# Altium footprint library Quectel.PCBLIB: 25 footprints (part 1 of 2)
Each footprint in its own frame and in the unit in brackets; x right, y up, seen from the top. Pads: shape width x height; smd on the part's side, far side on the other; paste and mask are expansions set on the pad; w line width, h text height; cw(c..) or ccw(c..) is an arc to the next point about the centre after c.
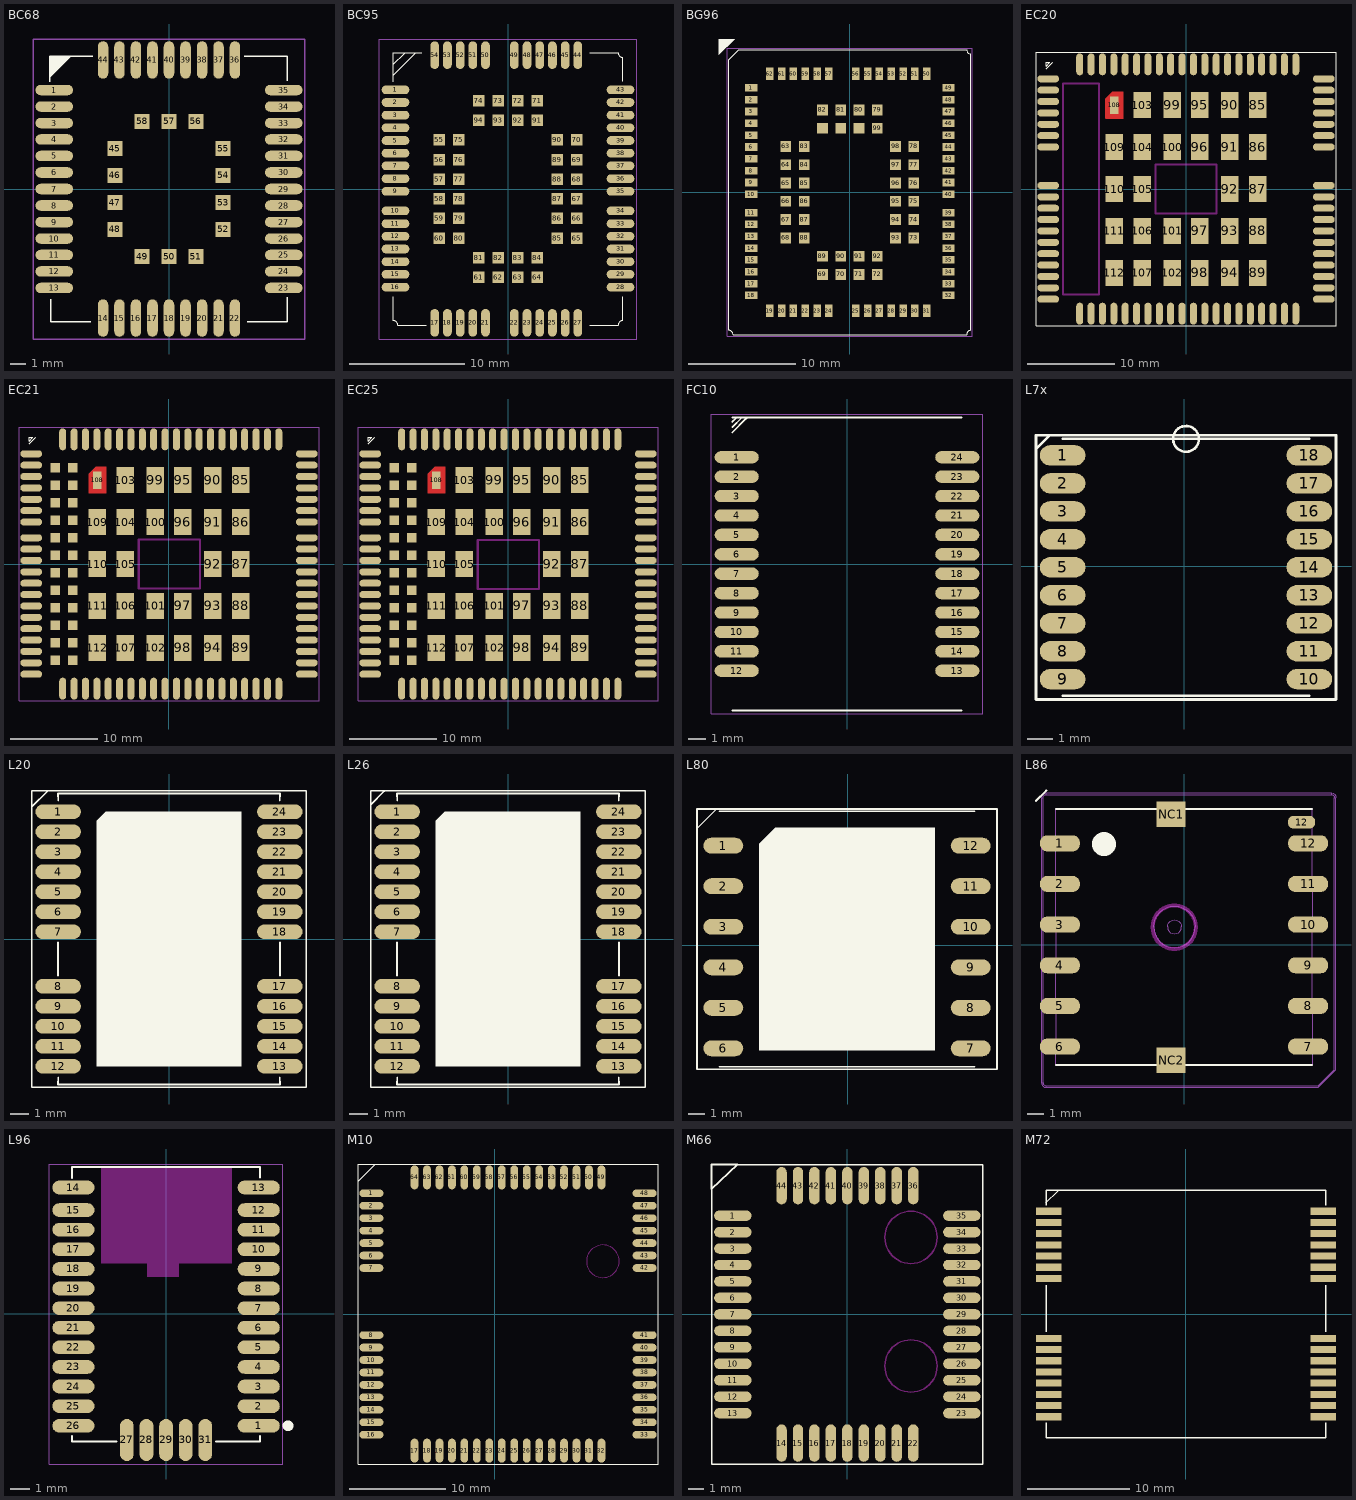
[diagram p0: the footprints below, top view; thin cyan lines are the x and y axes]

## BC68 [mm] "BC68 15.8X17.7mm H2.05mm RO"
height 2.05
pads (58):
  oval 2.5x0.7 smd paste+0 mask+0.05: 1(-7.65,6.6) 2(-7.65,5.5) 3(-7.65,4.4) 4(-7.65,3.3) 5(-7.65,2.2) 6(-7.65,1.1) 7(-7.65,0) 8(-7.65,-1.1) 9(-7.65,-2.2) 10(-7.65,-3.3) 11(-7.65,-4.4) 12(-7.65,-5.5) 13(-7.65,-6.6) 23(7.65,-6.6) 24(7.65,-5.5) 25(7.65,-4.4) 26(7.65,-3.3) 27(7.65,-2.2) 28(7.65,-1.1) 29(7.65,0) 30(7.65,1.1) 31(7.65,2.2) 32(7.65,3.3) 33(7.65,4.4) 34(7.65,5.5) 35(7.65,6.6)
  oval 0.7x2.5 smd paste+0 mask+0.05: 14(-4.4,-8.6) 15(-3.3,-8.6) 16(-2.2,-8.6) 17(-1.1,-8.6) 18(0,-8.6) 19(1.1,-8.6) 20(2.2,-8.6) 21(3.3,-8.6) 22(4.4,-8.6) 36(4.4,8.6) 37(3.3,8.6) 38(2.2,8.6) 39(1.1,8.6) 40(0,8.6) 41(-1.1,8.6) 42(-2.2,8.6) 43(-3.3,8.6) 44(-4.4,8.6)
  rect 1x1 smd mask+0.05: 45(-3.6,2.7) 46(-3.6,0.9) 47(-3.6,-0.9) 48(-3.6,-2.7) 49(-1.8,-4.5) 50(0,-4.5) 51(1.8,-4.5) 52(3.6,-2.7) 53(3.6,-0.9) 54(3.6,0.9) 55(3.6,2.7) 56(1.8,4.5) 57(0,4.5) 58(-1.8,4.5)
Top Overlay:
  region: -7.964,7.403 -7.964,8.865 -6.502,8.865
  lines w0.1: -7.95,7.163 -7.95,8.839 -5.08,8.85 ; -7.9,-7.341 -7.9,-8.85 -5.232,-8.85 ; 5.029,8.839 7.874,8.85 ; 5.206,-8.85 7.874,-8.85 7.874,-7.214 ; 7.9,7.214 7.9,8.85
Mechanical 1:
  lines w0.1: -9.05,-10 -9.05,10 9.05,10 9.05,-10 -9.05,-10
3D body "Quectel_BC68_3Dfile_201806292.stp": height 2, standoff 0, extent -7.926,-8.865 7.874,8.835
3D body: height 1.99, standoff 1, extent -6.325,-7.188 6.299,7.214
3D body: height 2, standoff 1, extent -5.918,4.216 -4.394,4.76

## BC95 [mm]
pads (94):
  oval 2.4x0.75 smd: 1(-9.75,8.6) 2(-9.75,7.5) 3(-9.75,6.4) 4(-9.75,5.3) 5(-9.75,4.2) 6(-9.75,3.1) 7(-9.75,2) 8(-9.75,0.9) 9(-9.75,-0.2) 10(-9.75,-1.9) 11(-9.75,-3) 12(-9.75,-4.1) 13(-9.75,-5.2) 14(-9.75,-6.3) 15(-9.75,-7.4) 16(-9.75,-8.5) 28(9.75,-8.5) 29(9.75,-7.4) 30(9.75,-6.3) 31(9.75,-5.2) 32(9.75,-4.1) 33(9.75,-3) 34(9.75,-1.9) 35(9.75,-0.2) 36(9.75,0.9) 37(9.75,2) 38(9.75,3.1) 39(9.75,4.2) 40(9.75,5.3) 41(9.75,6.4) 42(9.75,7.5) 43(9.75,8.6)
  oval 0.75x2.4 smd: 17(-6.35,-11.6) 18(-5.25,-11.6) 19(-4.15,-11.6) 20(-3.05,-11.6) 21(-1.95,-11.6) 22(0.55,-11.6) 23(1.65,-11.6) 24(2.75,-11.6) 25(3.85,-11.6) 26(4.95,-11.6) 27(6.05,-11.6) 44(6.05,11.6) 45(4.95,11.6) 46(3.85,11.6) 47(2.75,11.6) 48(1.65,11.6) 49(0.55,11.6) 50(-1.95,11.6) 51(-3.05,11.6) 52(-4.15,11.6) 53(-5.25,11.6) 54(-6.35,11.6)
  rect 1x1 smd: 55(-5.95,4.25) 56(-5.95,2.55) 57(-5.95,0.85) 58(-5.95,-0.85) 59(-5.95,-2.55) 60(-5.95,-4.25) 61(-2.55,-7.65) 62(-0.85,-7.65) 63(0.85,-7.65) 64(2.55,-7.65) 65(5.95,-4.25) 66(5.95,-2.55) 67(5.95,-0.85) 68(5.95,0.85) 69(5.95,2.55) 70(5.95,4.25) 71(2.55,7.65) 72(0.85,7.65) 73(-0.85,7.65) 74(-2.55,7.65) 75(-4.25,4.25) 76(-4.25,2.55) 77(-4.25,0.85) 78(-4.25,-0.85) 79(-4.25,-2.55) 80(-4.25,-4.25) 81(-2.55,-5.95) 82(-0.85,-5.95) 83(0.85,-5.95) 84(2.55,-5.95) 85(4.25,-4.25) 86(4.25,-2.55) 87(4.25,-0.85) 88(4.25,0.85) 89(4.25,2.55) 90(4.25,4.25) 91(2.55,5.95) 92(0.85,5.95) 93(-0.85,5.95) 94(-2.55,5.95)
Top Overlay:
  lines w0.1: -9.95,-9.321 -9.95,-11.4 cw(c-9.95,-11.8) -9.55,-11.8 -7.087,-11.8 ; -9.95,9.296 -9.95,11.375 ; -9.95,9.851 -8.001,11.8 -9.271,11.8 ; -9.95,10.414 -9.95,11.8 ; -9.931,10.82 -8.966,11.786 ; -8.437,11.8 -9.95,11.8 ; -7.487,11.8 -9.95,11.8 ; 7.087,-11.8 9.55,-11.8 cw(c9.95,-11.8) 9.95,-11.4 9.95,-9.321 ; 7.087,11.8 9.55,11.8 ccw(c9.95,11.8) 9.95,11.4 9.95,9.321
Mechanical 1:
  lines w0.01: -11.15,-13 11.15,-13 11.15,13 -11.15,13 -11.15,-13
3D body "quectel_bc95_3dfile_20170315_asm.stp": height 2.2, standoff 0, extent -9.95,-11.8 9.95,11.8

## BG96 [mm]
pads (102):
  rect 1.15x0.7 smd mask+0.05: 1(-9.175,9.7) 2(-9.175,8.6) 3(-9.175,7.5) 4(-9.175,6.4) 5(-9.175,5.3) 6(-9.175,4.2) 7(-9.175,3.1) 8(-9.175,2) 9(-9.175,0.9) 10(-9.175,-0.2) 11(-9.175,-1.9) 12(-9.175,-3) 13(-9.175,-4.1) 14(-9.175,-5.2) 15(-9.175,-6.3) 16(-9.175,-7.4) 17(-9.175,-8.5) 18(-9.175,-9.6) 32(9.175,-9.6) 33(9.175,-8.5) 34(9.175,-7.4) 35(9.175,-6.3) 36(9.175,-5.2) 37(9.175,-4.1) 38(9.175,-3) 39(9.175,-1.9) 40(9.175,-0.2) 41(9.175,0.9) 42(9.175,2) 43(9.175,3.1) 44(9.175,4.2) 45(9.175,5.3) 46(9.175,6.4) 47(9.175,7.5) 48(9.175,8.6) 49(9.175,9.7)
  rect 0.7x1.15 smd mask+0.05: 19(-7.45,-11.025) 20(-6.35,-11.025) 21(-5.25,-11.025) 22(-4.15,-11.025) 23(-3.05,-11.025) 24(-1.95,-11.025) 25(0.55,-11.025) 26(1.65,-11.025) 27(2.75,-11.025) 28(3.85,-11.025) 29(4.95,-11.025) 30(6.05,-11.025) 31(7.15,-11.025) 50(7.15,11.025) 51(6.05,11.025) 52(4.95,11.025) 53(3.85,11.025) 54(2.75,11.025) 55(1.65,11.025) 56(0.55,11.025) 57(-1.95,11.025) 58(-3.05,11.025) 59(-4.15,11.025) 60(-5.25,11.025) 61(-6.35,11.025) 62(-7.45,11.025)
  rect 1x1 smd mask+0.05: 63(-5.95,4.25) 64(-5.95,2.55) 65(-5.95,0.85) 66(-5.95,-0.85) 67(-5.95,-2.55) 68(-5.95,-4.25) 69(-2.55,-7.65) 70(-0.85,-7.65) 71(0.85,-7.65) 72(2.55,-7.65) 73(5.95,-4.25) 74(5.95,-2.55) 75(5.95,-0.85) 76(5.95,0.85) 77(5.95,2.55) 78(5.95,4.25) 79(2.55,7.65) 80(0.85,7.65) 81(-0.85,7.65) 82(-2.55,7.65) 83(-4.25,4.25) 84(-4.25,2.55) 85(-4.25,0.85) 86(-4.25,-0.85) 87(-4.25,-2.55) 88(-4.25,-4.25) 89(-2.55,-5.95) 90(-0.85,-5.95) 91(0.85,-5.95) 92(2.55,-5.95) 93(4.25,-4.25) 94(4.25,-2.55) 95(4.25,-0.85) 96(4.25,0.85) 97(4.25,2.55) 98(4.25,4.25) 99(2.55,5.95) 100(0.85,5.95) 101(-0.85,5.95) 102(-2.55,5.95)
Top Overlay:
  region: -12.18,14.24 -10.68,14.24 -12.18,12.79
  lines w0.1: -11.25,-12.85 cw(c-11.25,-13.25) -10.85,-13.25 10.85,-13.25 cw(c11.25,-13.25) 11.25,-12.85 11.25,12.85 cw(c11.25,13.25) 10.85,13.25 -10.33,13.25 -11.25,12.33 -11.25,-12.85
Mechanical 1:
  lines w0.01: -11.4,-13.4 11.4,-13.4 11.4,13.4 -11.4,13.4 -11.4,-13.4
3D body: height 2.29, standoff 1, extent -10.592,-12.649 10.668,12.294
3D body "quectel_bg96_3dfile_171025.stp": height 2.3, standoff 0, extent -11.25,-13.25 11.25,13.25
3D body: height 2.3, standoff 1, extent -10.084,8.865 -7.341,9.743

## EC20 [mm]
pads (140):
  oval 2.5x0.8 smd: 1(-15.75,12.6) 2(-15.75,11.3) 3(-15.75,10) 4(-15.75,8.7) 5(-15.75,7.4) 6(-15.75,6.1) 7(-15.75,4.8) 8(-15.75,0.4) 9(-15.75,-0.9) 10(-15.75,-2.2) 11(-15.75,-3.5) 12(-15.75,-4.8) 13(-15.75,-6.1) 14(-15.75,-7.4) 15(-15.75,-8.7) 16(-15.75,-10) 17(-15.75,-11.3) 18(-15.75,-12.6) 37(15.75,-12.6) 38(15.75,-11.3) 39(15.75,-10) 40(15.75,-8.7) 41(15.75,-7.4) 42(15.75,-6.1) 43(15.75,-4.8) 44(15.75,-3.5) 45(15.75,-2.2) 46(15.75,-0.9) 47(15.75,0.4) 48(15.75,4.8) 49(15.75,6.1) 50(15.75,7.4) 51(15.75,8.7) 52(15.75,10) 53(15.75,11.3) 54(15.75,12.6)
  oval 0.8x2.5 smd: 19(-9.55,-14.25) 20(-8.25,-14.25) 21(-6.95,-14.25) 22(-5.65,-14.25) 23(-4.35,-14.25) 24(-3.05,-14.25) 25(-1.75,-14.25) 26(-0.45,-14.25) 27(0.85,-14.25) 28(2.15,-14.25) 29(3.45,-14.25) 30(4.75,-14.25) 31(6.05,-14.25) 32(7.35,-14.25) 33(8.65,-14.25) 34(9.95,-14.25) 35(11.25,-14.25) 36(12.55,-14.25) 55(12.55,14.25) 56(11.25,14.25) 57(9.95,14.25) 58(8.65,14.25) 59(7.35,14.25) 60(6.05,14.25) 61(4.75,14.25) 62(3.45,14.25) 63(2.15,14.25) 64(0.85,14.25) 65(-0.45,14.25) 66(-1.75,14.25) 67(-3.05,14.25) 68(-4.35,14.25) 69(-5.65,14.25) 70(-6.95,14.25) 71(-8.25,14.25) 72(-9.55,14.25) 113(-10.85,14.25) 114(-12.15,14.25) 115(-10.85,-14.25) 116(-12.15,-14.25)
  rect 0x0 all layers, no hole: 73(2.4,1.6) 74(2.4,0) 75(2.4,-1.6) 76(0.8,1.6) 77(0.8,0) 78(0.8,-1.6) 79(-0.8,1.6) 80(-0.8,0) 81(-0.8,-1.6) 82(-2.4,1.6) 83(-2.4,0) 84(-2.4,-1.6) 117(-11,11) 118(-11,9) 119(-11,7) 120(-11,5) 121(-11,3) 122(-11,1) 123(-11,-1) 124(-11,-3) 125(-11,-5) 126(-11,-7) 127(-11,-9) 128(-11,-11) 129(-13,11) 130(-13,9) 131(-13,7) 132(-13,5) 133(-13,3) 134(-13,1) 135(-13,-1) 136(-13,-3) 137(-13,-5) 138(-13,-7) 139(-13,-9) 140(-13,-11)
  rect 2x3 smd: 85(8.2,9.6) 86(8.2,4.8) 87(8.2,0) 88(8.2,-4.8) 89(8.2,-9.6) 90(5,9.6) 91(5,4.8) 92(5,0) 93(5,-4.8) 94(5,-9.6) 95(1.6,9.6) 96(1.6,4.8) 97(1.6,-4.8) 98(1.6,-9.6) 99(-1.6,9.6) 100(-1.6,4.8) 101(-1.6,-4.8) 102(-1.6,-9.6) 103(-5,9.6) 104(-5,4.8) 105(-5,0) 106(-5,-4.8) 107(-5,-9.6) 109(-8.2,4.8) 110(-8.2,0) 111(-8.2,-4.8) 112(-8.2,-9.6)
  rect 1x2 smd: 108(-8.2,9.6)
Top Layer:
  rectangle: -8.357,8.1 -7.2,11.1
  rectangle: -9.169,8.1 -8.306,10.312
  rectangle: -8.458,10.109 -8.103,11.074
  rectangle: -8.534,10.109 -8.331,10.973
  rectangle: -8.636,10.185 -8.458,10.922
  rectangle: -8.712,10.185 -8.484,10.82
  rectangle: -8.788,10.16 -8.611,10.744
  rectangle: -8.865,10.185 -8.712,10.668
  rectangle: -8.941,10.262 -8.839,10.592
  rectangle: -9.017,10.262 -8.915,10.49
  rectangle: -9.093,10.262 -8.966,10.439
  rectangle: -9.119,10.262 -9.068,10.389
  lines w0.1: -9.2,8.1 -7.2,8.1 -7.2,11.1 -8.4,11.1 -9.2,10.3 -9.2,8.1
Top Layer keep-out:
  lines w0.254: -14.05,-12.05 -14.05,12.05 -9.95,12.05 -9.95,-12.05 -14.05,-12.05 ; -3.5,-2.8 -3.5,2.8 3.5,2.8 3.5,-2.8 -3.5,-2.8
Top Overlay:
  lines w0.01: -17.15,-15.65 17.15,-15.65 17.15,15.65 -17.15,15.65 -17.15,-15.65
  lines w0.102: -16,13.75 -15.25,14.5 ; -16,14.05 -16,14.5 -15.55,14.5 -16,14.05
Top Paste:
  rectangle: -9.144,10.262 -9.042,10.389
  rectangle: -9.068,10.287 -8.966,10.439
  rectangle: -8.992,10.363 -8.839,10.541
  rectangle: -8.865,10.389 -8.788,10.668
  rectangle: -8.814,10.541 -8.661,10.693
  rectangle: -8.636,10.516 -8.23,10.897
  rectangle: -8.433,10.973 -8.28,11.074
  rectangle: -8.56,10.82 -8.382,10.998
  rectangle: -8.712,10.693 -8.585,10.846
  rectangle: -9.093,10.287 -8.966,10.363
  rectangle: -8.89,10.389 -8.763,10.592
  rectangle: -8.738,10.516 -8.534,10.719
  rectangle: -8.611,10.592 -8.458,10.871
  rectangle: -8.458,10.897 -8.357,11.024
  rectangle: -8.534,10.617 -8.128,10.922
  rectangle: -8.814,10.439 -8.128,10.617
  rectangle: -9.017,10.3 -8.128,10.439
  rectangle: -8.382,8.1 -7.2,11.1
  rectangle: -9.2,8.128 -8.128,10.3
  lines w0.1: -9.2,8.1 -7.2,8.1 -7.2,11.1 -8.4,11.1 -9.2,10.3 -9.2,8.1
Top Solder:
  rectangle: -8.458,8.103 -7.15,11.15
  rectangle: -9.22,8.05 -8.357,10.363
  rectangle: -8.534,10.668 -8.407,11.074
  rectangle: -8.611,10.693 -8.509,10.998
  rectangle: -8.687,10.693 -8.611,10.947
  rectangle: -8.763,10.643 -8.661,10.871
  rectangle: -8.839,10.592 -8.738,10.795
  rectangle: -8.915,10.312 -8.763,10.719
  rectangle: -9.017,10.287 -8.839,10.617
  rectangle: -9.093,10.287 -8.966,10.541
  rectangle: -9.169,10.287 -9.017,10.465
  lines w0.1: -9.25,8.05 -7.15,8.05 -7.15,11.15 -8.45,11.15 -9.25,10.35 -9.25,8.05
3D body "ec20_3d_20150717_asm.stp": height 2.4, standoff 0, extent -16.002,-14.503 15.998,14.497

## EC21 [mm]
pads (132):
  oval 2.5x0.8 smd: 1(-15.75,12.6) 2(-15.75,11.3) 3(-15.75,10) 4(-15.75,8.7) 5(-15.75,7.4) 6(-15.75,6.1) 7(-15.75,4.8) 8(-15.75,0.4) 9(-15.75,-0.9) 10(-15.75,-2.2) 11(-15.75,-3.5) 12(-15.75,-4.8) 13(-15.75,-6.1) 14(-15.75,-7.4) 15(-15.75,-8.7) 16(-15.75,-10) 17(-15.75,-11.3) 18(-15.75,-12.6) 37(15.75,-12.6) 38(15.75,-11.3) 39(15.75,-10) 40(15.75,-8.7) 41(15.75,-7.4) 42(15.75,-6.1) 43(15.75,-4.8) 44(15.75,-3.5) 45(15.75,-2.2) 46(15.75,-0.9) 47(15.75,0.4) 48(15.75,4.8) 49(15.75,6.1) 50(15.75,7.4) 51(15.75,8.7) 52(15.75,10) 53(15.75,11.3) 54(15.75,12.6) 141(-15.75,3) 142(-15.75,1.7) 143(15.75,1.7) 144(15.75,3)
  oval 0.8x2.5 smd: 19(-9.55,-14.25) 20(-8.25,-14.25) 21(-6.95,-14.25) 22(-5.65,-14.25) 23(-4.35,-14.25) 24(-3.05,-14.25) 25(-1.75,-14.25) 26(-0.45,-14.25) 27(0.85,-14.25) 28(2.15,-14.25) 29(3.45,-14.25) 30(4.75,-14.25) 31(6.05,-14.25) 32(7.35,-14.25) 33(8.65,-14.25) 34(9.95,-14.25) 35(11.25,-14.25) 36(12.55,-14.25) 55(12.55,14.25) 56(11.25,14.25) 57(9.95,14.25) 58(8.65,14.25) 59(7.35,14.25) 60(6.05,14.25) 61(4.75,14.25) 62(3.45,14.25) 63(2.15,14.25) 64(0.85,14.25) 65(-0.45,14.25) 66(-1.75,14.25) 67(-3.05,14.25) 68(-4.35,14.25) 69(-5.65,14.25) 70(-6.95,14.25) 71(-8.25,14.25) 72(-9.55,14.25) 113(-10.85,14.25) 114(-12.15,14.25) 115(-10.85,-14.25) 116(-12.15,-14.25)
  rect 2x3 smd: 85(8.2,9.6) 86(8.2,4.8) 87(8.2,0) 88(8.2,-4.8) 89(8.2,-9.6) 90(5,9.6) 91(5,4.8) 92(5,0) 93(5,-4.8) 94(5,-9.6) 95(1.6,9.6) 96(1.6,4.8) 97(1.6,-4.8) 98(1.6,-9.6) 99(-1.6,9.6) 100(-1.6,4.8) 101(-1.6,-4.8) 102(-1.6,-9.6) 103(-5,9.6) 104(-5,4.8) 105(-5,0) 106(-5,-4.8) 107(-5,-9.6) 109(-8.2,4.8) 110(-8.2,0) 111(-8.2,-4.8) 112(-8.2,-9.6)
  rect 1x2 smd: 108(-8.2,9.6)
  rect 1.1x1.1 smd: 117(-11,11) 118(-11,9) 119(-11,7) 120(-11,5) 121(-11,3) 122(-11,1) 123(-11,-1) 124(-11,-3) 125(-11,-5) 126(-11,-7) 127(-11,-9) 128(-11,-11) 129(-13,11) 130(-13,9) 131(-13,7) 132(-13,5) 133(-13,3) 134(-13,1) 135(-13,-1) 136(-13,-3) 137(-13,-5) 138(-13,-7) 139(-13,-9) 140(-13,-11)
Top Layer:
  region: -9.2,10.3 -8.4,11.1 -7.2,11.1 -7.2,8.1 -9.2,8.1
Top Layer keep-out:
  lines w0.254: -3.449,-2.8 3.551,-2.8 3.551,2.8 -3.449,2.8 -3.449,-2.8
Top Overlay:
  lines w0.102: -16,13.75 -15.25,14.5 ; -16,14.05 -16,14.5 -15.55,14.5 -16,14.05
Top Paste:
  region: -9.2,10.3 -8.4,11.1 -7.2,11.1 -7.2,8.1 -9.2,8.1
Top Solder:
  region: -9.25,8.05 -7.15,8.05 -7.15,11.15 -8.45,11.15 -9.25,10.35
Mechanical 1:
  lines w0.01: -17.15,-15.65 17.15,-15.65 17.15,15.65 -17.15,15.65 -17.15,-15.65
3D body "Quectel EC21-AUTL.step": height 2.55, standoff 0.01, extent -16.002,-14.557 16.028,14.503

## EC25 [mm]
pads (132):
  oval 2.5x0.8 smd: 1(-15.75,12.6) 2(-15.75,11.3) 3(-15.75,10) 4(-15.75,8.7) 5(-15.75,7.4) 6(-15.75,6.1) 7(-15.75,4.8) 8(-15.75,0.4) 9(-15.75,-0.9) 10(-15.75,-2.2) 11(-15.75,-3.5) 12(-15.75,-4.8) 13(-15.75,-6.1) 14(-15.75,-7.4) 15(-15.75,-8.7) 16(-15.75,-10) 17(-15.75,-11.3) 18(-15.75,-12.6) 37(15.75,-12.6) 38(15.75,-11.3) 39(15.75,-10) 40(15.75,-8.7) 41(15.75,-7.4) 42(15.75,-6.1) 43(15.75,-4.8) 44(15.75,-3.5) 45(15.75,-2.2) 46(15.75,-0.9) 47(15.75,0.4) 48(15.75,4.8) 49(15.75,6.1) 50(15.75,7.4) 51(15.75,8.7) 52(15.75,10) 53(15.75,11.3) 54(15.75,12.6) 141(-15.75,3) 142(-15.75,1.7) 143(15.75,1.7) 144(15.75,3)
  oval 0.8x2.5 smd: 19(-9.55,-14.25) 20(-8.25,-14.25) 21(-6.95,-14.25) 22(-5.65,-14.25) 23(-4.35,-14.25) 24(-3.05,-14.25) 25(-1.75,-14.25) 26(-0.45,-14.25) 27(0.85,-14.25) 28(2.15,-14.25) 29(3.45,-14.25) 30(4.75,-14.25) 31(6.05,-14.25) 32(7.35,-14.25) 33(8.65,-14.25) 34(9.95,-14.25) 35(11.25,-14.25) 36(12.55,-14.25) 55(12.55,14.25) 56(11.25,14.25) 57(9.95,14.25) 58(8.65,14.25) 59(7.35,14.25) 60(6.05,14.25) 61(4.75,14.25) 62(3.45,14.25) 63(2.15,14.25) 64(0.85,14.25) 65(-0.45,14.25) 66(-1.75,14.25) 67(-3.05,14.25) 68(-4.35,14.25) 69(-5.65,14.25) 70(-6.95,14.25) 71(-8.25,14.25) 72(-9.55,14.25) 113(-10.85,14.25) 114(-12.15,14.25) 115(-10.85,-14.25) 116(-12.15,-14.25)
  rect 2x3 smd: 85(8.2,9.6) 86(8.2,4.8) 87(8.2,0) 88(8.2,-4.8) 89(8.2,-9.6) 90(5,9.6) 91(5,4.8) 92(5,0) 93(5,-4.8) 94(5,-9.6) 95(1.6,9.6) 96(1.6,4.8) 97(1.6,-4.8) 98(1.6,-9.6) 99(-1.6,9.6) 100(-1.6,4.8) 101(-1.6,-4.8) 102(-1.6,-9.6) 103(-5,9.6) 104(-5,4.8) 105(-5,0) 106(-5,-4.8) 107(-5,-9.6) 109(-8.2,4.8) 110(-8.2,0) 111(-8.2,-4.8) 112(-8.2,-9.6)
  rect 1x2 smd: 108(-8.2,9.6)
  rect 1.1x1.1 smd: 117(-11,11) 118(-11,9) 119(-11,7) 120(-11,5) 121(-11,3) 122(-11,1) 123(-11,-1) 124(-11,-3) 125(-11,-5) 126(-11,-7) 127(-11,-9) 128(-11,-11) 129(-13,11) 130(-13,9) 131(-13,7) 132(-13,5) 133(-13,3) 134(-13,1) 135(-13,-1) 136(-13,-3) 137(-13,-5) 138(-13,-7) 139(-13,-9) 140(-13,-11)
Top Layer:
  region: -9.2,10.3 -8.4,11.1 -7.2,11.1 -7.2,8.1 -9.2,8.1
Top Layer keep-out:
  lines w0.254: -3.449,-2.851 3.551,-2.851 3.551,2.749 -3.449,2.749 -3.449,-2.851
Top Overlay:
  lines w0.102: -16,13.75 -15.25,14.5 ; -16,14.05 -16,14.5 -15.55,14.5 -16,14.05
Top Paste:
  region: -9.2,10.3 -8.4,11.1 -7.2,11.1 -7.2,8.1 -9.2,8.1
Top Solder:
  region: -9.25,8.05 -7.15,8.05 -7.15,11.15 -8.45,11.15 -9.25,10.35
Mechanical 1:
  lines w0.01: -17.15,-15.65 17.15,-15.65 17.15,15.65 -17.15,15.65 -17.15,-15.65
3D body "ec25_3d_20160713_asm.stp": height 2.4, standoff 0, extent -16.002,-14.497 15.998,14.503

## FC10 [mm]
pads (24):
  oval 2.5x0.7 smd: 1(-6.25,6.05) 2(-6.25,4.95) 3(-6.25,3.85) 4(-6.25,2.75) 5(-6.25,1.65) 6(-6.25,0.55) 7(-6.25,-0.55) 8(-6.25,-1.65) 9(-6.25,-2.75) 10(-6.25,-3.85) 11(-6.25,-4.95) 12(-6.25,-6.05) 13(6.25,-6.05) 14(6.25,-4.95) 15(6.25,-3.85) 16(6.25,-2.75) 17(6.25,-1.65) 18(6.25,-0.55) 19(6.25,0.55) 20(6.25,1.65) 21(6.25,2.75) 22(6.25,3.85) 23(6.25,4.95) 24(6.25,6.05)
Top Overlay:
  lines w0.1: -6.5,-8.3 6.5,-8.3 ; -6.5,8.3 6.5,8.3
  lines w0.102: -6.5,7.45 -5.7,8.25 ; -6.5,7.75 -5.95,8.3 ; -6.5,8.05 -6.25,8.3
Mechanical 1:
  lines w0.01: -7.7,-8.5 -7.7,8.5 7.7,8.5 7.7,-8.5 -7.7,-8.5
3D body "fc20_3d_160530_asm.stp": height 2.2, standoff 0, extent -6.449,-8.3 6.551,8.3

## L7x [mm]
pads (18):
  oval 1.8x0.8 smd: 1(-4.772,4.354) 2(-4.772,3.254) 3(-4.772,2.154) 4(-4.772,1.054) 5(-4.772,-0.046) 6(-4.772,-1.146) 7(-4.772,-2.246) 8(-4.772,-3.346) 9(-4.772,-4.446) 10(4.928,-4.446) 11(4.928,-3.346) 12(4.928,-2.246) 13(4.928,-1.146) 14(4.928,-0.046) 15(4.928,1.054) 16(4.928,2.154) 17(4.928,3.254) 18(4.928,4.354)
Top Overlay:
  circle w0.102: c0.078,5.004 r0.508
  lines w0.102: -5.822,4.604 -5.272,5.154 ; -4.772,-5.096 4.928,-5.096 ; -4.772,5.004 4.928,5.004 ; -5.822,-5.246 -5.822,5.154 5.978,5.154 5.978,-5.246 -5.822,-5.246
3D body "L70_3d_150728_asm.stp": height 2.5, standoff 0, extent -4.775,-5.105 4.925,4.995

## L20 [mm]
pads (24):
  oval 2.5x0.8 smd: 1(-6.1,7) 2(-6.1,5.9) 3(-6.1,4.8) 4(-6.1,3.7) 5(-6.1,2.6) 6(-6.1,1.5) 7(-6.1,0.4) 8(-6.1,-2.6) 9(-6.1,-3.7) 10(-6.1,-4.8) 11(-6.1,-5.9) 12(-6.1,-7) 13(6.1,-7) 14(6.1,-5.9) 15(6.1,-4.8) 16(6.1,-3.7) 17(6.1,-2.6) 18(6.1,0.4) 19(6.1,1.5) 20(6.1,2.6) 21(6.1,3.7) 22(6.1,4.8) 23(6.1,5.9) 24(6.1,7)
Top Overlay:
  rectangle: -4,-7 4,6.5
  rectangle: -3.5,6 4,7
  region: -3.5,6 -3,6.5 -3.5,7 -4,6.5
  lines w0.1: -6.1,-2 -6.1,-0.2 ; -6.096,-7.62 -6.1,-8 6.1,-8 6.096,-7.62 ; -6.096,7.62 -6.1,8 6.1,8 6.096,7.62 ; 6.1,-2 6.1,-0.2 ; -7.55,-8.15 -7.55,8.15 7.55,8.15 7.55,-8.15 -7.55,-8.15
  lines w0.102: -7.518,7.29 -6.667,8.141
3D body "User Library-L20.step": height 3.3, standoff 0, extent -6.096,-8.001 6.104,7.999

## L26 [mm]
pads (24):
  oval 2.5x0.8 smd: 1(-6.1,7) 2(-6.1,5.9) 3(-6.1,4.8) 4(-6.1,3.7) 5(-6.1,2.6) 6(-6.1,1.5) 7(-6.1,0.4) 8(-6.1,-2.6) 9(-6.1,-3.7) 10(-6.1,-4.8) 11(-6.1,-5.9) 12(-6.1,-7) 13(6.1,-7) 14(6.1,-5.9) 15(6.1,-4.8) 16(6.1,-3.7) 17(6.1,-2.6) 18(6.1,0.4) 19(6.1,1.5) 20(6.1,2.6) 21(6.1,3.7) 22(6.1,4.8) 23(6.1,5.9) 24(6.1,7)
Top Overlay:
  region: -3.5,6 -3,6.5 -3.5,7 -4,6.5
  rectangle: -3.5,6 4,7
  rectangle: -4,-7 4,6.5
  lines w0.1: -6.1,-2 -6.1,-0.2 ; -6.096,-7.62 -6.1,-8 6.1,-8 6.096,-7.62 ; -6.096,7.62 -6.1,8 6.1,8 6.096,7.62 ; 6.1,-2 6.1,-0.2 ; -7.55,-8.15 7.55,-8.15 7.55,8.15 -7.55,8.15 -7.55,-8.15
  lines w0.102: -7.544,7.391 -6.794,8.141
3D body "User Library-L20.step": height 3.3, standoff 0, extent -6.096,-8.001 6.104,7.999

## L80 [mm]
pads (12):
  oval 2.5x1 smd: 1(-7.801,6.231) 2(-7.801,3.691) 3(-7.801,1.151) 4(-7.801,-1.389) 5(-7.801,-3.929) 6(-7.801,-6.469) 7(7.699,-6.469) 8(7.699,-3.929) 9(7.699,-1.389) 10(7.699,1.151) 11(7.699,3.691) 12(7.699,6.231)
Top Layer:
  region: -5.051,8.081 -6.051,8.081 -6.051,8.081 -5.051,8.081
Top Overlay:
  region: 5.449,7.381 -4.551,7.381 -4.551,5.131 5.449,5.131
  region: 5.449,6.381 -5.551,6.381 -5.551,-6.619 5.449,-6.619
  region: -5.551,6.381 -4.844,5.674 -3.854,6.664 -4.561,7.371
  lines w0.1: -8.051,-7.619 7.949,-7.619 ; -8.051,8.381 7.949,8.381 ; -9.451,-7.769 -9.451,8.531 9.349,8.531 9.349,-7.769 -9.451,-7.769
  lines w0.102: -9.423,7.341 -8.23,8.534
3D body "User Library-quectel-l80_2.stp": height 7.15, standoff 0, extent -8.026,-7.595 7.974,8.405

## L86 [mm]
pads (15):
  rrect90% 2.5x1 smd: 1(-7.75,6.35) 2(-7.75,3.81) 3(-7.75,1.27) 4(-7.75,-1.27) 5(-7.75,-3.81) 6(-7.75,-6.35) 7(7.75,-6.35) 8(7.75,-3.81) 9(7.75,-1.27) 10(7.75,1.27) 11(7.75,3.81) 12(7.75,6.35)
  rrect90% 1.7x0.8 smd: 12(7.344,7.67)
  rect 1.8x1.6 smd mask+0.068: NC1(-0.813,8.153) NC2(-0.813,-7.199)
Top Layer keep-out:
  circle w0.254: c-0.61,1.11 r1.352
Top Overlay:
  circle w1.27: c-5,6.3 r0.111
  lines w0.127: -9.246,9.004 -8.606,9.644 ; -8,-7.5 8,-7.5 ; -8,8.5 8,8.5
Mechanical 1:
  drawing of 227 lines, arcs and shapes, not listed
3D body "User Library-L86.step": height 7.48, standoff 0.01, extent -9.238,-8.694 9.162,9.706

## L96 [mm]
pads (31):
  oval 2.15x0.7 smd mask+0.05: 1(4.725,-5.713) 2(4.725,-4.713) 3(4.725,-3.712) 4(4.725,-2.713) 5(4.725,-1.713) 6(4.725,-0.713) 7(4.725,0.288) 8(4.725,1.288) 9(4.725,2.287) 10(4.725,3.287) 11(4.725,4.287) 12(4.725,5.288) 13(4.725,6.438) 14(-4.725,6.438) 15(-4.725,5.288) 16(-4.725,4.287) 17(-4.725,3.287) 18(-4.725,2.287) 19(-4.725,1.288) 20(-4.725,0.288) 21(-4.725,-0.713) 22(-4.725,-1.713) 23(-4.725,-2.713) 24(-4.725,-3.712) 25(-4.725,-4.713) 26(-4.725,-5.713)
  oval 0.7x2.15 smd mask+0.05: 27(-2,-6.438) 28(-1,-6.438) 29(0,-6.438) 30(1,-6.438) 31(2,-6.438)
Top Overlay:
  circle w0.5: c6.223,-5.715 r0.025
  lines w0.1: -4.8,-6.223 -4.8,-6.513 -2.54,-6.513 ; -4.801,6.934 -4.801,7.488 ; 2.54,-6.512 4.8,-6.513 ; 4.801,-6.223 4.801,-6.513 ; 4.801,6.96 4.801,7.488 ; -4.8,7.488 4.8,7.488 ; -4.801,7.488 -4.8,7.488 ; 4.8,-6.513 4.801,-6.513 ; 4.8,7.488 4.801,7.488
Keep-Out Layer:
  region: -3.302,7.488 3.353,7.488 3.353,2.588 0.65,2.588 0.65,1.887 -0.95,1.887 -0.95,2.588 -3.302,2.588
Mechanical 1:
  lines w0.01: -5.95,-7.662 -5.95,7.638 5.95,7.638 5.95,-7.662 -5.95,-7.662
3D body "l96.step": height 2.01, standoff 0.01, extent -4.8,-6.5 4.8,7.5

## M10 [mm]
pads (64):
  oval 2.5x0.8 smd: 1(-12.853,12.6) 2(-12.853,11.3) 3(-12.853,10) 4(-12.853,8.7) 5(-12.853,7.4) 6(-12.853,6.1) 7(-12.853,4.8) 8(-12.853,-2.2) 9(-12.853,-3.5) 10(-12.853,-4.8) 11(-12.853,-6.1) 12(-12.853,-7.4) 13(-12.853,-8.7) 14(-12.853,-10) 15(-12.853,-11.3) 16(-12.853,-12.6) 33(15.647,-12.6) 34(15.647,-11.3) 35(15.647,-10) 36(15.647,-8.7) 37(15.647,-7.4) 38(15.647,-6.1) 39(15.647,-4.8) 40(15.647,-3.5) 41(15.647,-2.2) 42(15.647,4.8) 43(15.647,6.1) 44(15.647,7.4) 45(15.647,8.7) 46(15.647,10) 47(15.647,11.3) 48(15.647,12.6)
  oval 0.8x2.5 smd: 17(-8.353,-14.25) 18(-7.053,-14.25) 19(-5.753,-14.25) 20(-4.453,-14.25) 21(-3.153,-14.25) 22(-1.853,-14.25) 23(-0.553,-14.25) 24(0.747,-14.25) 25(2.047,-14.25) 26(3.347,-14.25) 27(4.647,-14.25) 28(5.947,-14.25) 29(7.247,-14.25) 30(8.547,-14.25) 31(9.847,-14.25) 32(11.147,-14.25) 49(11.147,14.25) 50(9.847,14.25) 51(8.547,14.25) 52(7.247,14.25) 53(5.947,14.25) 54(4.647,14.25) 55(3.347,14.25) 56(2.047,14.25) 57(0.747,14.25) 58(-0.553,14.25) 59(-1.853,14.25) 60(-3.153,14.25) 61(-4.453,14.25) 62(-5.753,14.25) 63(-7.053,14.25) 64(-8.353,14.25)
Top Layer keep-out:
  circle w0.1: c11.297,5.5 r1.7
Top Overlay:
  lines w0.1: -14.253,-15.65 -14.253,15.65 17.047,15.65 17.047,-15.65 -14.253,-15.65 ; -14.253,13.865 -14.253,15.625 -12.468,15.625 -14.253,13.865
3D body "User Library-M10.step": height 3.9, standoff 0, extent -13.106,-14.503 15.894,14.497

## M66 [mm]
pads (44):
  oval 2.5x0.7 smd: 1(-7.65,6.6) 2(-7.65,5.5) 3(-7.65,4.4) 4(-7.65,3.3) 5(-7.65,2.2) 6(-7.65,1.1) 7(-7.65,0) 8(-7.65,-1.1) 9(-7.65,-2.2) 10(-7.65,-3.3) 11(-7.65,-4.4) 12(-7.65,-5.5) 13(-7.65,-6.6) 23(7.65,-6.6) 24(7.65,-5.5) 25(7.65,-4.4) 26(7.65,-3.3) 27(7.65,-2.2) 28(7.65,-1.1) 29(7.65,0) 30(7.65,1.1) 31(7.65,2.2) 32(7.65,3.3) 33(7.65,4.4) 34(7.65,5.5) 35(7.65,6.6)
  oval 0.7x2.5 smd: 14(-4.4,-8.6) 15(-3.3,-8.6) 16(-2.2,-8.6) 17(-1.1,-8.6) 18(0,-8.6) 19(1.1,-8.6) 20(2.2,-8.6) 21(3.3,-8.6) 22(4.4,-8.6) 36(4.4,8.6) 37(3.3,8.6) 38(2.2,8.6) 39(1.1,8.6) 40(0,8.6) 41(-1.1,8.6) 42(-2.2,8.6) 43(-3.3,8.6) 44(-4.4,8.6)
Top Layer keep-out:
  circle w0.1: c4.25,5.15 r1.75
  circle w0.1: c4.25,-3.45 r1.75
Top Overlay:
  lines w0.1: -9.1,8.352 -7.339,10.05 -9.1,10.05 -9.1,8.352 ; -9.05,-10 9.05,-10 9.05,10 -9.05,10 -9.05,-10
3D body "m66_3d_150917_asm.stp": height 2.3, standoff 0, extent -7.899,-8.839 7.901,8.861

## M72 [mm]
pads (30):
  rect 2.5x0.7 smd: 1(-13.5,10.1) 2(-13.5,9) 3(-13.5,7.9) 4(-13.5,6.8) 5(-13.5,5.7) 6(-13.5,4.6) 7(-13.5,3.5) 8(-13.5,-2.4) 9(-13.5,-3.5) 10(-13.5,-4.6) 11(-13.5,-5.7) 12(-13.5,-6.8) 13(-13.5,-7.9) 14(-13.5,-9) 15(-13.5,-10.1) 16(13.5,-10.1) 17(13.5,-9) 18(13.5,-7.9) 19(13.5,-6.8) 20(13.5,-5.7) 21(13.5,-4.6) 22(13.5,-3.5) 23(13.5,-2.4) 24(13.5,3.5) 25(13.5,4.6) 26(13.5,5.7) 27(13.5,6.8) 28(13.5,7.9) 29(13.5,9) 30(13.5,10.1)
Top Overlay:
  lines w0.102: -13.767,10.947 -12.573,12.141
  lines w0.127: -13.75,-10.7 -13.75,-12.15 13.75,-12.15 13.75,-10.675 ; -13.75,-1.75 -13.75,2.85 ; -13.75,10.675 -13.75,12.15 13.75,12.15 13.75,10.7 ; 13.75,-1.75 13.75,2.85
3D body "User Library-Module_GSM_M72.STEP": height 3.6, standoff -0.01, extent -13.76,-12 13.76,12